# Altium footprint library Vowstar_Module.PcbLib: 57 footprints (part 4 of 4)
Each footprint in its own frame and in the unit in brackets; x right, y up, seen from the top. Pads: shape width x height; smd on the part's side, far side on the other; paste and mask are expansions set on the pad; w line width, h text height; cw(c..) or ccw(c..) is an arc to the next point about the centre after c.
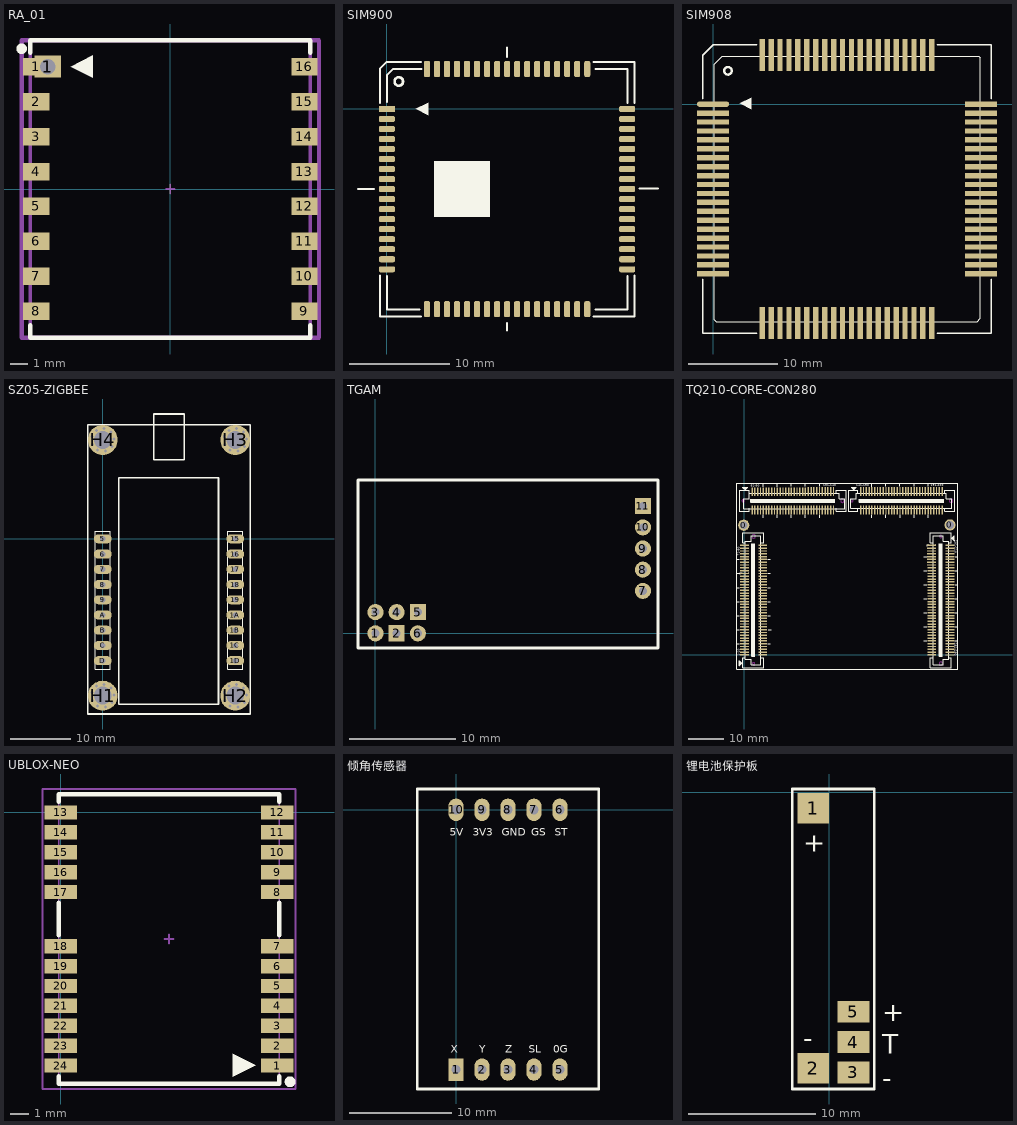
[diagram p3: the footprints below, top view; thin cyan lines are the x and y axes]

## RA_01 [mm] "RA_01 LoRa Module by AI-Thinker"
height 3.2
pads (17):
  rect 1.5x1 smd: 1(-7.664,7) 2(-7.664,5) 3(-7.664,3) 4(-7.664,1) 5(-7.664,-1) 6(-7.664,-3) 7(-7.664,-5) 8(-7.664,-7) 9(7.664,-7) 10(7.664,-5) 11(7.664,-3) 12(7.664,-1) 13(7.664,1) 14(7.664,3) 15(7.664,5) 16(7.664,7)
  rect 1.524x1.27 hole 0.889: 1(-7,7)
Top Overlay:
  circle w0.3: c-8.499,8.019 r0.15
  region: -5.69,7 -4.42,6.365 -4.42,7.635
  lines w0.254: -8,-7.8 -8,-8.5 8,-8.5 8,-7.8 ; -8,7.8 -8,8.5 8,8.5 8,7.8
Mechanical 13:
  lines w0.2: -8,-8.5 -8,8.5 8,8.5 8,-8.5 -8,-8.5
Mechanical 15:
  lines w0.1: -0.254,0 0.254,0 ; 0,-0.254 0,0.254
  lines w0.254: -8.5,-8.5 8.5,-8.5 8.5,8.5 -8.5,8.5 -8.5,-8.5
3D body "RA-01.STEP": height 3.1, standoff 0, extent -8,-8.5 8,8.5

## SIM900 [mm] "SIM900/SIM900A PCB Footprint"
height 2
pads (68):
  rect 1.6x0.6 smd: 1(0,0)
  rrect50% 1.6x0.6 smd: 2(0,-1) 3(0,-2) 4(0,-3) 5(0,-4) 6(0,-5) 7(0,-6) 8(0,-7) 9(0,-8) 10(0,-9) 11(0,-10) 12(0,-11) 13(0,-12) 14(0,-13) 15(0,-14) 16(0,-15) 17(0,-16) 35(23.989,-16) 36(23.989,-15) 37(23.989,-14) 38(23.989,-13) 39(23.989,-12) 40(23.989,-11) 41(23.989,-10) 42(23.989,-9) 43(23.989,-8) 44(23.989,-7) 45(23.989,-6) 46(23.989,-5) 47(23.989,-4) 48(23.989,-3) 49(23.989,-2) 50(23.989,-1) 51(23.989,0)
  rrect50% 0.6x1.6 smd: 18(4,-19.989) 19(5,-19.989) 20(6,-19.989) 21(7,-19.989) 22(8,-19.989) 23(9,-19.989) 24(10,-19.989) 25(11,-19.989) 26(12,-19.989) 27(13,-19.989) 28(14,-19.989) 29(15,-19.989) 30(16,-19.989) 31(17,-19.989) 32(18,-19.989) 33(19,-19.989) 34(20,-19.989) 52(20,3.989) 53(19,3.989) 54(18,3.989) 55(17,3.989) 56(16,3.989) 57(15,3.989) 58(14,3.989) 59(13,3.989) 60(12,3.989) 61(11,3.989) 62(10,3.989) 63(9,3.989) 64(8,3.989) 65(7,3.989) 66(6,3.989) 67(5,3.989) 68(4,3.989)
Top Overlay:
  circle w0.254: c1.186,2.744 r0.426
  rectangle: 4.7,-10.8 10.3,-5.2
  region: 2.881,0.001 4.151,-0.634 4.151,0.636
  lines w0.2: -0.7,-16.6 -0.7,-20.7 3.4,-20.7 ; -0.7,0.6 -0.7,4 0,4.7 3.4,4.7 ; 0,-16.687 0,-20 3.237,-20 ; 0,0.712 0,3.354 0.646,4 3.44,4 ; 20.6,-20.7 24.7,-20.7 24.7,-16.6 ; 20.6,4.7 24.7,4.7 24.7,0.6 ; 20.814,-20 24,-20 24,-16.661 ; 20.839,4 24,4 24,0.611
  lines w0.203: -2.884,-8 -1.31,-8 ; 12,-22.098 12,-21.386 ; 12,5.208 12,6.122 ; 25.208,-7.949 27.062,-7.949
Bottom Overlay:
  circle w0.508: c11.506,0 r1.524
3D body "User Library-SIM900.step": height 3.02, standoff 0, extent 0.014,-19.976 24.014,4.024

## SIM908 [mm] "SIM908 PCB Footprint"
height 2
pads (80):
  oval 3.6x0.6 smd: 1(0,0)
  rect 3.6x0.6 smd: 2(0,-1) 3(0,-2) 4(0,-3) 5(0,-4) 6(0,-5) 7(0,-6) 8(0,-7) 9(0,-8) 10(0,-9) 11(0,-10) 12(0,-11) 13(0,-12) 14(0,-13) 15(0,-14) 16(0,-15) 17(0,-16) 18(0,-17) 19(0,-18) 20(0,-19) 41(30,-19) 42(30,-18) 43(30,-17) 44(30,-16) 45(30,-15) 46(30,-14) 47(30,-13) 48(30,-12) 49(30,-11) 50(30,-10) 51(30,-9) 52(30,-8) 53(30,-7) 54(30,-6) 55(30,-5) 56(30,-4) 57(30,-3) 58(30,-2) 59(30,-1) 60(30,0)
  rect 0.6x3.6 smd: 21(5.5,-24.5) 22(6.5,-24.5) 23(7.5,-24.5) 24(8.5,-24.5) 25(9.5,-24.5) 26(10.5,-24.5) 27(11.5,-24.5) 28(12.5,-24.5) 29(13.5,-24.5) 30(14.5,-24.5) 31(15.5,-24.5) 32(16.5,-24.5) 33(17.5,-24.5) 34(18.5,-24.5) 35(19.5,-24.5) 36(20.5,-24.5) 37(21.5,-24.5) 38(22.5,-24.5) 39(23.5,-24.5) 40(24.5,-24.5) 61(24.5,5.5) 62(23.5,5.5) 63(22.5,5.5) 64(21.5,5.5) 65(20.5,5.5) 66(19.5,5.5) 67(18.5,5.5) 68(17.5,5.5) 69(16.5,5.5) 70(15.5,5.5) 71(14.5,5.5) 72(13.5,5.5) 73(12.5,5.5) 74(11.5,5.5) 75(10.5,5.5) 76(9.5,5.5) 77(8.5,5.5) 78(7.5,5.5) 79(6.5,5.5) 80(5.5,5.5)
Top Overlay:
  circle w0.254: c1.668,3.735 r0.426
  region: 3.008,0.077 4.278,-0.558 4.278,0.712
  lines w0.127: 0.152,-24.155 0.152,0.584 0.152,4.496 0.864,5.207 1.041,5.385 28.499,5.385 29.743,5.385 29.947,5.182 29.947,-0.152 29.947,-23.978 29.566,-24.359 22.301,-24.359 0.356,-24.359 0.152,-24.155
  lines w0.2: -1.15,-19.6 -1.15,-25.65 4.9,-25.65 ; -1.15,0.6 -1.15,5.5 0,6.65 4.9,6.65 ; 25.1,-25.65 31.15,-25.65 31.15,-19.6 ; 25.1,6.65 31.15,6.65 31.15,0.6
3D body "User Library-SIM908.STEP": height 3.19, standoff -0.01, extent 0.069,-24.415 30.069,5.585

## SZ05-ZIGBEE [mm] "SZ05-ZIGBEE"
pads (22):
  oval 3x1.5 hole 0.9: 1A(22.098,-12.7) 1B(22.098,-15.24) 1C(22.098,-17.78) 1D(22.098,-20.32) 5(0,0) 6(0,-2.54) 7(0,-5.08) 8(0,-7.62) 9(0,-10.16) 15(22.098,0) 16(22.098,-2.54) 17(22.098,-5.08) 18(22.098,-7.62) 19(22.098,-10.16) A(0,-12.7) B(0,-15.24) C(0,-17.78) D(0,-20.32)
  round 5 hole 3: H1(0,-26.162) H2(22.098,-26.162) H3(22.098,16.51) H4(0,16.51)
via 1.905,16.637 diameter 0.7 hole 0.5
via 1.378,17.832 diameter 0.7 hole 0.5
via 0.206,18.408 diameter 0.7 hole 0.5
via -1.062,18.096 diameter 0.7 hole 0.5
via -0.843,14.797 diameter 0.7 hole 0.5
via 0.456,14.656 diameter 0.7 hole 0.5
via 1.541,15.383 diameter 0.7 hole 0.5
via -1.747,15.739 diameter 0.7 hole 0.5
via -1.834,17.042 diameter 0.7 hole 0.5
via 24.003,16.637 diameter 0.7 hole 0.5
via 23.476,17.832 diameter 0.7 hole 0.5
via 22.304,18.408 diameter 0.7 hole 0.5
via 21.036,18.096 diameter 0.7 hole 0.5
via 21.255,14.797 diameter 0.7 hole 0.5
via 22.554,14.656 diameter 0.7 hole 0.5
via 23.639,15.383 diameter 0.7 hole 0.5
via 20.351,15.739 diameter 0.7 hole 0.5
via 20.264,17.042 diameter 0.7 hole 0.5
via 24.003,-26.035 diameter 0.7 hole 0.5
via 23.476,-24.84 diameter 0.7 hole 0.5
via 22.304,-24.264 diameter 0.7 hole 0.5
via 21.036,-24.576 diameter 0.7 hole 0.5
via 21.255,-27.875 diameter 0.7 hole 0.5
via 22.554,-28.016 diameter 0.7 hole 0.5
via 23.639,-27.289 diameter 0.7 hole 0.5
via 20.351,-26.933 diameter 0.7 hole 0.5
via 20.264,-25.63 diameter 0.7 hole 0.5
via 1.905,-26.035 diameter 0.7 hole 0.5
via 1.378,-24.84 diameter 0.7 hole 0.5
via 0.206,-24.264 diameter 0.7 hole 0.5
via -1.062,-24.576 diameter 0.7 hole 0.5
via -0.843,-27.875 diameter 0.7 hole 0.5
via 0.456,-28.016 diameter 0.7 hole 0.5
via 1.541,-27.289 diameter 0.7 hole 0.5
via -1.747,-26.933 diameter 0.7 hole 0.5
via -1.834,-25.63 diameter 0.7 hole 0.5
Top Overlay:
  lines w0.2: -1.27,-21.717 -1.27,1.27 1.27,1.27 1.27,-0.635 1.27,-21.717 -1.27,-21.717 ; 20.828,-21.717 23.368,-21.717 23.368,-0.635 23.368,1.27 20.828,1.27 20.828,-21.717
  lines w0.254: -2.54,-29.21 -2.54,19.05 24.638,19.05 24.638,-29.21 -2.54,-29.21 ; 2.667,-27.559 2.667,-5.842 2.667,10.16 19.304,10.16 19.304,-5.715 19.304,-27.559 2.667,-27.559 ; 8.509,13.208 13.589,13.208 13.589,20.828 8.509,20.828 8.509,13.208

## TGAM [mil]
pads (11):
  round 60 hole 30: 1(0,0) 3(0,78.74) 4(78.74,78.74) 6(157.48,0) 7(994.09,157.48) 8(994.09,236.22) 9(994.09,314.96) 10(994.09,393.7)
  rect 60x60 hole 30: 2(78.74,0) 5(157.48,78.74) 11(994.09,472.44)
Top Overlay:
  lines w10: -65,-55 1050,-55 1050,570 -65,570 -65,-55

## TQ210-CORE-CON280 [mm] "TQ210-CORE-CON280"
height 7.62
pads (282):
  round 3.2 hole 2.2: 0(-0.203,36.939) 0(58.522,37.015)
  rect 2.5x0.4 smd: 1(0,0) 2(5.2,0) 3(0,0.8) 4(5.2,0.8) 5(0,1.6) 6(5.2,1.6) 7(0,2.4) 8(5.2,2.4) 9(0,3.2) 10(5.2,3.2) 11(0,4) 12(5.2,4) 13(0,4.8) 14(5.2,4.8) 15(0,5.6) 16(5.2,5.6) 17(0,6.4) 18(5.2,6.4) 19(0,7.2) 20(5.2,7.2) 21(0,8) 22(5.2,8) 23(0,8.8) 24(5.2,8.8) 25(0,9.6) 26(5.2,9.6) 27(0,10.4) 28(5.2,10.4) 29(0,11.2) 30(5.2,11.2) 31(0,12) 32(5.2,12) 33(0,12.8) 34(5.2,12.8) 35(0,13.6) 36(5.2,13.6) 37(0,14.4) 38(5.2,14.4) 39(0,15.2) 40(5.2,15.2) 41(0,16) 42(5.2,16) 43(0,16.8) 44(5.2,16.8) 45(0,17.6) 46(5.2,17.6) 47(0,18.4) 48(5.2,18.4) 49(0,19.2) 50(5.2,19.2) 51(0,20) 52(5.2,20) 53(0,20.8) 54(5.2,20.8) 55(0,21.6) 56(5.2,21.6) 57(0,22.4) 58(5.2,22.4) 59(0,23.2) 60(5.2,23.2) 61(0,24) 62(5.2,24) 63(0,24.8) 64(5.2,24.8) 65(0,25.6) 66(5.2,25.6) 67(0,26.4) 68(5.2,26.4) 69(0,27.2) 70(5.2,27.2) 71(0,28) 72(5.2,28) 73(0,28.8) 74(5.2,28.8) 75(0,29.6) 76(5.2,29.6) 77(0,30.4) 78(5.2,30.4) 79(0,31.2) 80(5.2,31.2) 201(58.5,31.2) 202(53.3,31.2) 203(58.5,30.4) 204(53.3,30.4) 205(58.5,29.6) 206(53.3,29.6) 207(58.5,28.8) 208(53.3,28.8) 209(58.5,28) 210(53.3,28) 211(58.5,27.2) 212(53.3,27.2) 213(58.5,26.4) 214(53.3,26.4) 215(58.5,25.6) 216(53.3,25.6) 217(58.515,24.795) 218(53.315,24.795) 219(58.515,23.995) 220(53.315,23.995) 221(58.515,23.195) 222(53.315,23.195) 223(58.515,22.395) 224(53.315,22.395) 225(58.515,21.595) 226(53.315,21.595) 227(58.515,20.795) 228(53.315,20.795) 229(58.515,19.995) 230(53.315,19.995) 231(58.515,19.195) 232(53.315,19.195) 233(58.515,18.395) 234(53.315,18.395) 235(58.515,17.595) 236(53.315,17.595) 237(58.515,16.795) 238(53.315,16.795) 239(58.515,15.995) 240(53.315,15.995) 241(58.515,15.195) 242(53.315,15.195) 243(58.515,14.395) 244(53.315,14.395) 245(58.515,13.595) 246(53.315,13.595) 247(58.515,12.795) 248(53.315,12.795) 249(58.515,11.995) 250(53.315,11.995) 251(58.515,11.195) 252(53.315,11.195) 253(58.515,10.395) 254(53.315,10.395) 255(58.515,9.595) 256(53.315,9.595) 257(58.515,8.795) 258(53.315,8.795) 259(58.515,7.995) 260(53.315,7.995) 261(58.515,7.195) 262(53.315,7.195) 263(58.515,6.395) 264(53.315,6.395) 265(58.515,5.595) 266(53.315,5.595) 267(58.515,4.795) 268(53.315,4.795) 269(58.515,3.995) 270(53.315,3.995) 271(58.515,3.195) 272(53.315,3.195) 273(58.515,2.395) 274(53.315,2.395) 275(58.515,1.595) 276(53.315,1.595) 277(58.515,0.795) 278(53.315,0.795) 279(58.515,-0.005) 280(53.315,0.006)
  rect 0.4x2.5 smd: 81(2.165,46.497) 82(2.165,41.297) 83(2.965,46.497) 84(2.965,41.297) 85(3.765,46.497) 86(3.765,41.297) 87(4.565,46.497) 88(4.565,41.297) 89(5.365,46.497) 90(5.365,41.297) 91(6.165,46.497) 92(6.165,41.297) 93(6.965,46.497) 94(6.965,41.297) 95(7.765,46.497) 96(7.765,41.297) 97(8.565,46.497) 98(8.565,41.297) 99(9.365,46.497) 100(9.365,41.297) 101(10.165,46.497) 102(10.165,41.297) 103(10.965,46.497) 104(10.965,41.297) 105(11.765,46.497) 106(11.765,41.297) 107(12.565,46.497) 108(12.565,41.297) 109(13.365,46.497) 110(13.365,41.297) 111(14.165,46.497) 112(14.165,41.297) 113(14.965,46.497) 114(14.965,41.297) 115(15.765,46.497) 116(15.765,41.297) 117(16.565,46.497) 118(16.565,41.297) 119(17.365,46.497) 120(17.365,41.297) 121(18.171,46.506) 122(18.171,41.306) 123(18.971,46.506) 124(18.971,41.306) 125(19.771,46.506) 126(19.771,41.306) 127(20.571,46.506) 128(20.571,41.306) 129(21.371,46.506) 130(21.371,41.306) 131(22.171,46.506) 132(22.171,41.306) 133(22.971,46.506) 134(22.971,41.306) 135(23.771,46.506) 136(23.771,41.306) 137(24.571,46.506) 138(24.571,41.306) 139(25.371,46.506) 140(25.371,41.306) 141(33.096,46.506) 142(33.096,41.306) 143(33.896,46.506) 144(33.896,41.306) 145(34.696,46.506) 146(34.696,41.306) 147(35.496,46.506) 148(35.496,41.306) 149(36.296,46.506) 150(36.296,41.306) 151(37.096,46.506) 152(37.096,41.306) 153(37.896,46.506) 154(37.896,41.306) 155(38.696,46.506) 156(38.696,41.306) 157(39.496,46.506) 158(39.496,41.306) 159(40.296,46.506) 160(40.296,41.306) 161(41.096,46.506) 162(41.096,41.306) 163(41.896,46.506) 164(41.896,41.306) 165(42.696,46.506) 166(42.696,41.306) 167(43.496,46.506) 168(43.496,41.306) 169(44.296,46.506) 170(44.296,41.306) 171(45.096,46.506) 172(45.096,41.306) 173(45.896,46.506) 174(45.896,41.306) 175(46.696,46.506) 176(46.696,41.306) 177(47.496,46.506) 178(47.496,41.306) 179(48.296,46.506) 180(48.296,41.306) 181(49.096,46.506) 182(49.096,41.306) 183(49.896,46.506) 184(49.896,41.306) 185(50.696,46.506) 186(50.696,41.306) 187(51.496,46.506) 188(51.496,41.306) 189(52.296,46.506) 190(52.296,41.306) 191(53.096,46.506) 192(53.096,41.306) 193(53.896,46.506) 194(53.896,41.306) 195(54.696,46.506) 196(54.696,41.306) 197(55.496,46.506) 198(55.496,41.306) 199(56.296,46.506) 200(56.296,41.306)
Top Overlay:
  drawing of 206 lines, arcs and shapes, not listed
  text "71-80" at -1.353,28.278 h0.64
  text "131-140" at 22.372,48.014 h0.64
  text "201-210" at 59.922,32.697 h0.64
  text "141-150" at 31.847,47.988 h0.64
  text "281-280" at 59.822,3.503 h0.64
  text "191-200" at 52.997,47.988 h0.64
  text "81-90" at 1.847,47.963 h0.64
  text "1-10" at -1.378,-0.297 h0.64
Keep-Out Layer:
  circle w0.254: c30.572,43.924 r0.35
  circle w0.254: c58.822,43.924 r0.5
  circle w0.254: c-0.353,43.924 r0.35
  circle w0.254: c27.872,43.899 r0.5
  circle w0.254: c55.915,-2.491 r0.5
  circle w0.254: c2.622,33.739 r0.5
  circle w0.254: c2.597,-2.507 r0.35
  circle w0.254: c55.915,33.709 r0.35

## UBLOX-NEO [mm] "UBLOX GPS Module NEO 5,6,7,M8"
pads (24):
  rect 1.8x0.8 smd: 1(12,-14) 2(12,-12.9) 3(12,-11.8) 4(12,-10.7) 5(12,-9.6) 6(12,-8.5) 7(12,-7.4) 8(12,-4.4) 9(12,-3.3) 10(12,-2.2) 11(12,-1.1) 12(12,0) 13(0,0) 14(0,-1.1) 15(0,-2.2) 16(0,-3.3) 17(0,-4.4) 18(0,-7.4) 19(0,-8.5) 20(0,-9.6) 21(0,-10.7) 22(0,-11.8) 23(0,-12.9) 24(0,-14)
Top Overlay:
  circle w0.3: c12.7,-14.9 r0.15
  region: 10.792,-13.977 9.522,-13.342 9.522,-14.612
  lines w0.254: -0.1,-14.6 -0.1,-15 12.1,-15 12.1,-14.6 ; -0.1,-6.8 -0.1,-5 ; -0.1,0.6 -0.1,1 12.1,1 12.1,0.6 ; 12.1,-6.8 12.1,-5
Mechanical 13:
  lines w0.1: -0.1,-15 -0.1,1 12.1,1 12.1,-15 -0.1,-15
Mechanical 15:
  lines w0.1: 5.746,-7 6.254,-7 ; 6,-7.254 6,-6.746 ; -1,-15.3 13,-15.3 13,1.3 -1,1.3 -1,-15.3
3D body "User Library-UBLOX_GPS_NEO-6M.STEP": height 2.64, standoff 0, extent -0.18,-15.3 12.18,1.3

## 倾角传感器 [mm] "倾角传感器"
pads (10):
  rect 1.5x2.2 hole 0.9: 1(0,-25.4)
  oval 1.5x2.2 hole 0.9: 2(2.54,-25.4) 3(5.08,-25.4) 4(7.62,-25.4) 5(10.16,-25.4) 6(10.16,0) 7(7.62,0) 8(5.08,0) 9(2.54,0) 10(0,0)
Top Overlay:
  lines w0.254: -3.81,-27.305 -3.81,2.032 13.97,2.032 13.97,-27.305 -3.81,-27.305
  text "X" at -0.508,-23.749 h0.76
  text "Y" at 2.286,-23.749 h0.76
  text "Z" at 4.826,-23.749 h0.76
  text "SL" at 7.112,-23.749 h0.76
  text "0G" at 9.525,-23.749 h0.76
  text "ST" at 9.652,-2.54 h0.76
  text "GS" at 7.366,-2.54 h0.76
  text "GND" at 4.445,-2.54 h0.76
  text "3V3" at 1.651,-2.54 h0.76
  text "5V" at -0.635,-2.54 h0.76

## 锂电池保护板 [mm] "锂电池保护板"
pads (5):
  rect 2.5x2.4 smd: 1(-1.27,-1.27) 2(-1.27,-21.717)
  rect 2.5x1.7 smd: 3(1.905,-22.067) 4(1.905,-19.67) 5(1.905,-17.272)
Top Overlay:
  lines w0.2: 3.556,0.127 3.556,-23.368 -2.921,-23.368 -2.921,0.254 3.556,0.254
  text "-" at -2.032,-20.066 h1.52
  text "+" at -2.032,-4.699 h1.52
  text "-" at 4.191,-23.241 h1.52
  text "+" at 4.191,-18.034 h1.52
  text "T" at 4.191,-20.574 h1.52